# Altium footprint library PCB-PCEIOT.PcbLib: 119 footprints (part 3 of 8)
Each footprint in its own frame and in the unit in brackets; x right, y up, seen from the top. Pads: shape width x height; smd on the part's side, far side on the other; paste and mask are expansions set on the pad; w line width, h text height; cw(c..) or ccw(c..) is an arc to the next point about the centre after c.
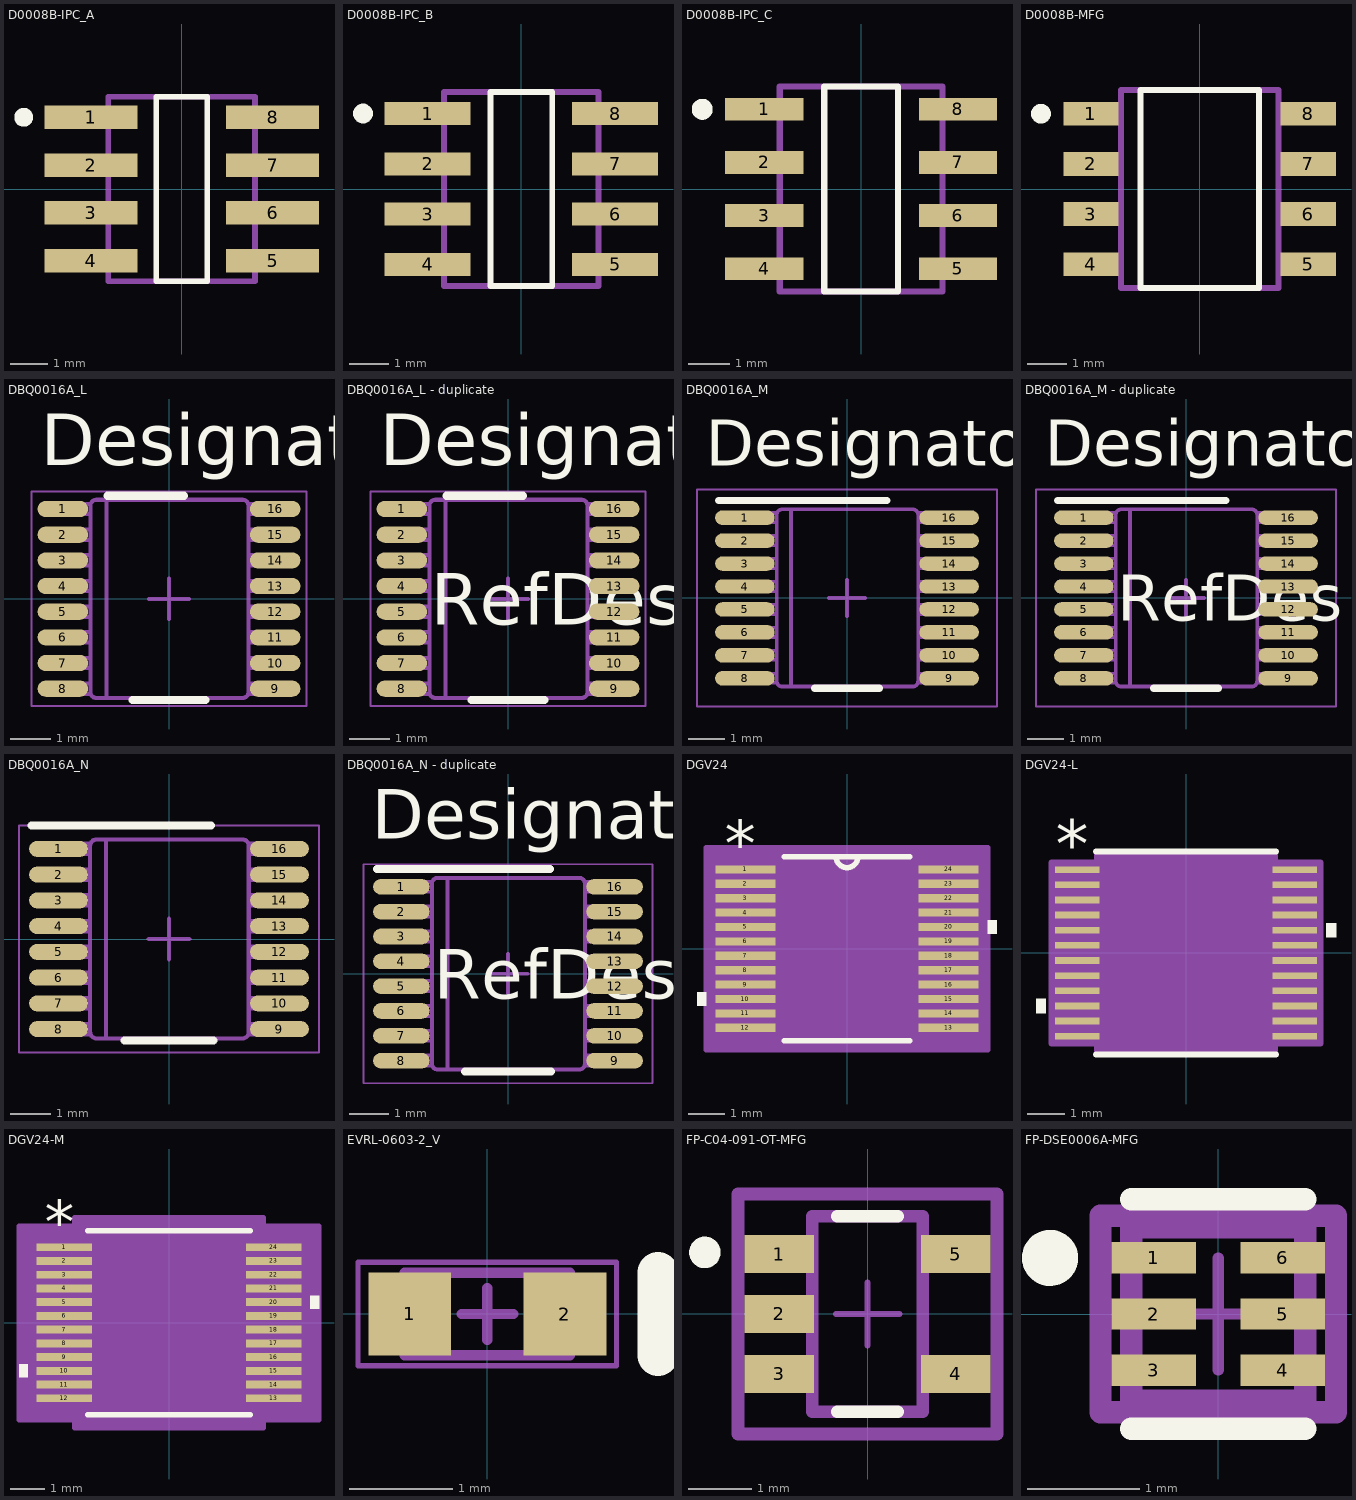
[diagram p2: the footprints below, top view; thin cyan lines are the x and y axes]

## D0008B-IPC_A [mm]
pads (8):
  rect 2.469x0.622 smd paste+0 mask+0: 1(-2.414,1.905) 2(-2.414,0.635) 3(-2.414,-0.635) 4(-2.414,-1.905) 5(2.414,-1.905) 6(2.414,-0.635) 7(2.414,0.635) 8(2.414,1.905)
Top Overlay:
  circle w0.25: c-4.198,1.905 r0.125
  lines w0.15: -0.679,-2.452 0.679,-2.452 0.679,2.452 -0.679,2.452 -0.679,-2.452
Mechanical 13:
  lines w0.15: -1.947,-2.452 1.947,-2.452 1.947,2.452 -1.947,2.452 -1.947,-2.452
Mechanical 15:
  text ".Designator" at 0.272,-2.705 h1.2

## D0008B-IPC_B [mm]
pads (8):
  rect 2.169x0.582 smd paste+0 mask+0: 1(-2.364,1.905) 2(-2.364,0.635) 3(-2.364,-0.635) 4(-2.364,-1.905) 5(2.364,-1.905) 6(2.364,-0.635) 7(2.364,0.635) 8(2.364,1.905)
Top Overlay:
  circle w0.25: c-3.998,1.905 r0.125
  lines w0.15: -0.779,-2.452 -0.779,2.452 0.779,2.452 0.779,-2.452 -0.779,-2.452
Mechanical 13:
  lines w0.15: -1.947,-2.452 -1.947,2.452 1.947,2.452 1.947,-2.452 -1.947,-2.452
Mechanical 15:
  text ".Designator" at 0.272,-2.705 h1.2

## D0008B-IPC_C [mm]
pads (8):
  rect 1.869x0.542 smd paste+0 mask+0: 1(-2.314,1.905) 2(-2.314,0.635) 3(-2.314,-0.635) 4(-2.314,-1.905) 5(2.314,-1.905) 6(2.314,-0.635) 7(2.314,0.635) 8(2.314,1.905)
Top Overlay:
  circle w0.25: c-3.798,1.905 r0.125
  lines w0.15: -0.879,-2.452 -0.879,2.452 0.879,2.452 0.879,-2.452 -0.879,-2.452
Mechanical 13:
  lines w0.15: -1.947,-2.452 -1.947,2.452 1.947,2.452 1.947,-2.452 -1.947,-2.452
Mechanical 15:
  text ".Designator" at 0.272,-2.705 h1.2

## D0008B-MFG [mm]
pads (8):
  rect 1.4x0.6 smd paste+0 mask+0: 1(-2.75,1.905) 2(-2.75,0.635) 3(-2.75,-0.635) 4(-2.75,-1.905) 5(2.75,-1.905) 6(2.75,-0.635) 7(2.75,0.635) 8(2.75,1.905)
Top Overlay:
  circle w0.25: c-4.015,1.905 r0.125
  lines w0.15: -1.5,-2.5 1.5,-2.5 1.5,2.5 -1.5,2.5 -1.5,-2.5
Mechanical 13:
  lines w0.15: -1.99,-2.5 1.99,-2.5 1.99,2.5 -1.99,2.5 -1.99,-2.5
Mechanical 15:
  text ".Designator" at 0.272,-2.705 h1.2

## DBQ0016A_L [mm]
pads (16):
  oval 1.25x0.4 smd paste+0 mask+0.051: 1(-2.625,2.222) 2(-2.625,1.587) 3(-2.625,0.953) 4(-2.625,0.318) 5(-2.625,-0.318) 6(-2.625,-0.953) 7(-2.625,-1.587) 8(-2.625,-2.222) 9(2.625,-2.222) 10(2.625,-1.587) 11(2.625,-0.953) 12(2.625,-0.318) 13(2.625,0.318) 14(2.625,0.953) 15(2.625,1.587) 16(2.625,2.222)
Top Overlay:
  lines w0.2: -1.525,2.55 0.375,2.55 ; -0.9,-2.5 0.9,-2.5
  text "Designator238" at -3.175,3.302 h1.27
  text ".Designator" at -3.492,-0.635 h1.27
Mechanical 13:
  drawing of 209 lines, arcs and shapes, not listed
  text ".Designator" at -3.492,-0.635 h1.27
Mechanical 15:
  lines w0.05: -3.4,-2.65 3.4,-2.65 3.4,2.65 -3.4,2.65 -3.4,-2.65
  lines w0.1: -0.5,0 0.5,0 ; 0,-0.5 0,0.5

## DBQ0016A_L - duplicate [mm]
pads (16):
  oval 1.25x0.4 smd paste+0 mask+0.051: 1(-2.625,2.222) 2(-2.625,1.587) 3(-2.625,0.953) 4(-2.625,0.318) 5(-2.625,-0.318) 6(-2.625,-0.953) 7(-2.625,-1.587) 8(-2.625,-2.222) 9(2.625,-2.222) 10(2.625,-1.587) 11(2.625,-0.953) 12(2.625,-0.318) 13(2.625,0.318) 14(2.625,0.953) 15(2.625,1.587) 16(2.625,2.222)
Top Overlay:
  lines w0.2: -1.525,2.55 0.375,2.55 ; -0.9,-2.5 0.9,-2.5
  text "RefDes" at -1.905,-0.635 h1.27
  text "Designator238" at -3.175,3.302 h1.27
Mechanical 13:
  drawing of 209 lines, arcs and shapes, not listed
Mechanical 15:
  lines w0.05: -3.4,-2.65 -3.4,2.65 3.4,2.65 3.4,-2.65 -3.4,-2.65
  lines w0.1: -0.5,0 0.5,0 ; 0,-0.5 0,0.5

## DBQ0016A_M [mm]
pads (16):
  oval 1.65x0.4 smd paste+0 mask+0.051: 1(-2.825,2.222) 2(-2.825,1.587) 3(-2.825,0.953) 4(-2.825,0.318) 5(-2.825,-0.318) 6(-2.825,-0.953) 7(-2.825,-1.587) 8(-2.825,-2.222) 9(2.825,-2.222) 10(2.825,-1.587) 11(2.825,-0.953) 12(2.825,-0.318) 13(2.825,0.318) 14(2.825,0.953) 15(2.825,1.587) 16(2.825,2.222)
Top Overlay:
  lines w0.2: -3.55,2.7 1.1,2.7 ; -0.9,-2.5 0.9,-2.5
  text ".Designator" at -3.492,-0.635 h1.27
  text "Designator239" at -3.912,3.658 h1.27
Mechanical 13:
  drawing of 209 lines, arcs and shapes, not listed
  text ".Designator" at -3.492,-0.635 h1.27
Mechanical 15:
  lines w0.05: -4.15,-3 4.15,-3 4.15,3 -4.15,3 -4.15,-3
  lines w0.1: -0.5,0 0.5,0 ; 0,-0.5 0,0.5

## DBQ0016A_M - duplicate [mm]
pads (16):
  oval 1.65x0.4 smd paste+0 mask+0.051: 1(-2.825,2.222) 2(-2.825,1.587) 3(-2.825,0.953) 4(-2.825,0.318) 5(-2.825,-0.318) 6(-2.825,-0.953) 7(-2.825,-1.587) 8(-2.825,-2.222) 9(2.825,-2.222) 10(2.825,-1.587) 11(2.825,-0.953) 12(2.825,-0.318) 13(2.825,0.318) 14(2.825,0.953) 15(2.825,1.587) 16(2.825,2.222)
Top Overlay:
  lines w0.2: -3.55,2.7 1.1,2.7 ; -0.9,-2.5 0.9,-2.5
  text "RefDes" at -1.905,-0.635 h1.27
  text "Designator239" at -3.912,3.658 h1.27
Mechanical 13:
  drawing of 209 lines, arcs and shapes, not listed
Mechanical 15:
  lines w0.05: -4.15,-3 4.15,-3 4.15,3 -4.15,3 -4.15,-3
  lines w0.1: -0.5,0 0.5,0 ; 0,-0.5 0,0.5

## DBQ0016A_N [mm]
pads (16):
  oval 1.45x0.4 smd paste+0 mask+0.051: 1(-2.725,2.222) 2(-2.725,1.587) 3(-2.725,0.953) 4(-2.725,0.318) 5(-2.725,-0.318) 6(-2.725,-0.953) 7(-2.725,-1.587) 8(-2.725,-2.222) 9(2.725,-2.222) 10(2.725,-1.587) 11(2.725,-0.953) 12(2.725,-0.318) 13(2.725,0.318) 14(2.725,0.953) 15(2.725,1.587) 16(2.725,2.222)
Top Overlay:
  lines w0.2: -3.391,2.8 1.034,2.8 ; -1.1,-2.5 1.1,-2.5
Mechanical 13:
  drawing of 209 lines, arcs and shapes, not listed
Mechanical 15:
  lines w0.05: -3.7,-2.8 3.7,-2.8 3.7,2.8 -3.7,2.8 -3.7,-2.8
  lines w0.1: -0.5,0 0.5,0 ; 0,-0.5 0,0.5

## DBQ0016A_N - duplicate [mm]
pads (16):
  oval 1.45x0.4 smd paste+0 mask+0.051: 1(-2.725,2.222) 2(-2.725,1.587) 3(-2.725,0.953) 4(-2.725,0.318) 5(-2.725,-0.318) 6(-2.725,-0.953) 7(-2.725,-1.587) 8(-2.725,-2.222) 9(2.725,-2.222) 10(2.725,-1.587) 11(2.725,-0.953) 12(2.725,-0.318) 13(2.725,0.318) 14(2.725,0.953) 15(2.725,1.587) 16(2.725,2.222)
Top Overlay:
  lines w0.2: -3.35,2.675 1.075,2.675 ; -1.1,-2.5 1.1,-2.5
  text "RefDes" at -1.905,-0.635 h1.27
  text "Designator240" at -3.48,3.454 h1.27
Mechanical 13:
  drawing of 209 lines, arcs and shapes, not listed
Mechanical 15:
  lines w0.05: -3.7,-2.8 3.7,-2.8 3.7,2.8 -3.7,2.8 -3.7,-2.8
  lines w0.1: -0.5,0 0.5,0 ; 0,-0.5 0,0.5

## DGV24 [mil]
pads (24):
  rect 66x9 smd paste-33 mask-33: 1(-111,86.61) 2(-111,70.87) 3(-111,55.12) 4(-111,39.37) 5(-111,23.62) 6(-111,7.87) 7(-111,-7.87) 8(-111,-23.62) 9(-111,-39.37) 10(-111,-55.12) 11(-111,-70.87) 12(-111,-86.61) 13(111,-86.61) 14(111,-70.87) 15(111,-55.12) 16(111,-39.37) 17(111,-23.62) 18(111,-7.87) 19(111,7.87) 20(111,23.62) 21(111,39.37) 22(111,55.12) 23(111,70.87) 24(111,86.61)
Top Overlay:
  region: -154,-47.62 -164,-47.62 -164,-62.62 -154,-62.62
  region: 154,31.12 164,31.12 164,16.12 154,16.12
  lines w6: -68.86,-100.5 68.86,-100.5 ; -68.86,100.5 68.86,100.5 ; -12,100.5 ccw(c0,100.5) 12,100.5
  text "*" at -133.5,90.61 h50
Mechanical 13:
  lines w1: -12,100.5 ccw(c0,100.5) 12,100.5 ; -130,-91.11 -130,-82.11 -88.5,-82.11 -88.5,-91.11 -130,-91.11 ; -130,-75.37 -130,-66.37 -88.5,-66.37 -88.5,-75.37 -130,-75.37 ; -130,-59.62 -130,-50.62 -88.5,-50.62 -88.5,-59.62 -130,-59.62 ; -130,-43.87 -130,-34.87 -88.5,-34.87 -88.5,-43.87 -130,-43.87 ; -130,-28.12 -130,-19.12 -88.5,-19.12 -88.5,-28.12 -130,-28.12 ; -130,-12.37 -130,-3.37 -88.5,-3.37 -88.5,-12.37 -130,-12.37 ; -130,3.37 -130,12.37 -88.5,12.37 -88.5,3.37 -130,3.37 ; -130,19.12 -130,28.12 -88.5,28.12 -88.5,19.12 -130,19.12 ; -130,34.87 -130,43.87 -88.5,43.87 -88.5,34.87 -130,34.87 ; -130,50.62 -130,59.62 -88.5,59.62 -88.5,50.62 -130,50.62 ; -130,66.37 -130,75.37 -88.5,75.37 -88.5,66.37 -130,66.37 ; -130,82.11 -130,91.11 -88.5,91.11 -88.5,82.11 -130,82.11 ; -88.5,-100.5 88.5,-100.5 88.5,100.5 -88.5,100.5 -88.5,-100.5 ; 88.5,-91.11 88.5,-82.11 130,-82.11 130,-91.11 88.5,-91.11 ; 88.5,-75.37 88.5,-66.37 130,-66.37 130,-75.37 88.5,-75.37 ; 88.5,-59.62 88.5,-50.62 130,-50.62 130,-59.62 88.5,-59.62 ; 88.5,-43.87 88.5,-34.87 130,-34.87 130,-43.87 88.5,-43.87 ; 88.5,-28.12 88.5,-19.12 130,-19.12 130,-28.12 88.5,-28.12 ; 88.5,-12.37 88.5,-3.37 130,-3.37 130,-12.37 88.5,-12.37 ; 88.5,3.37 88.5,12.37 130,12.37 130,3.37 88.5,3.37 ; 88.5,19.12 88.5,28.12 130,28.12 130,19.12 88.5,19.12 ; 88.5,34.87 88.5,43.87 130,43.87 130,34.87 88.5,34.87 ; 88.5,50.62 88.5,59.62 130,59.62 130,50.62 88.5,50.62 ; 88.5,66.37 88.5,75.37 130,75.37 130,66.37 88.5,66.37 ; 88.5,82.11 88.5,91.11 130,91.11 130,82.11 88.5,82.11
  text "*" at -133.5,90.61 h50
Mechanical 15:
  region: 154,-110.5 -154,-110.5 -154,110.5 154,110.5
  lines w6: -154,-110.5 -154,110.5 154,110.5 154,-110.5 -154,-110.5
3D body "DGV24.step": height 47.09, standoff 0, extent -130,-100.51 130,100.51

## DGV24-L [mil]
pads (24):
  rect 46x7 smd paste+0 mask+0: 1(-113,86.61) 2(-113,70.87) 3(-113,55.12) 4(-113,39.37) 5(-113,23.62) 6(-113,7.87) 7(-113,-7.87) 8(-113,-23.62) 9(-113,-39.37) 10(-113,-55.12) 11(-113,-70.87) 12(-113,-86.61) 13(113,-86.61) 14(113,-70.87) 15(113,-55.12) 16(113,-39.37) 17(113,-23.62) 18(113,-7.87) 19(113,7.87) 20(113,23.62) 21(113,39.37) 22(113,55.12) 23(113,70.87) 24(113,86.61)
Top Overlay:
  region: -146,-47.62 -156,-47.62 -156,-62.62 -146,-62.62
  region: 146,31.12 156,31.12 156,16.12 146,16.12
  lines w6: -93.5,-105.5 93.5,-105.5 ; -93.5,105.5 93.5,105.5
  text "*" at -135.5,88.61 h50
  text ".Designator" at -137.5,-25 h50
Mechanical 13:
  lines w1: -12,100.5 ccw(c0,100.5) 12,100.5 ; -130,-91.11 -130,-82.11 -88.5,-82.11 -88.5,-91.11 -130,-91.11 ; -130,-75.37 -130,-66.37 -88.5,-66.37 -88.5,-75.37 -130,-75.37 ; -130,-59.62 -130,-50.62 -88.5,-50.62 -88.5,-59.62 -130,-59.62 ; -130,-43.87 -130,-34.87 -88.5,-34.87 -88.5,-43.87 -130,-43.87 ; -130,-28.12 -130,-19.12 -88.5,-19.12 -88.5,-28.12 -130,-28.12 ; -130,-12.37 -130,-3.37 -88.5,-3.37 -88.5,-12.37 -130,-12.37 ; -130,3.37 -130,12.37 -88.5,12.37 -88.5,3.37 -130,3.37 ; -130,19.12 -130,28.12 -88.5,28.12 -88.5,19.12 -130,19.12 ; -130,34.87 -130,43.87 -88.5,43.87 -88.5,34.87 -130,34.87 ; -130,50.62 -130,59.62 -88.5,59.62 -88.5,50.62 -130,50.62 ; -130,66.37 -130,75.37 -88.5,75.37 -88.5,66.37 -130,66.37 ; -130,82.11 -130,91.11 -88.5,91.11 -88.5,82.11 -130,82.11 ; -88.5,-100.5 88.5,-100.5 88.5,100.5 -88.5,100.5 -88.5,-100.5 ; 88.5,-91.11 88.5,-82.11 130,-82.11 130,-91.11 88.5,-91.11 ; 88.5,-75.37 88.5,-66.37 130,-66.37 130,-75.37 88.5,-75.37 ; 88.5,-59.62 88.5,-50.62 130,-50.62 130,-59.62 88.5,-59.62 ; 88.5,-43.87 88.5,-34.87 130,-34.87 130,-43.87 88.5,-43.87 ; 88.5,-28.12 88.5,-19.12 130,-19.12 130,-28.12 88.5,-28.12 ; 88.5,-12.37 88.5,-3.37 130,-3.37 130,-12.37 88.5,-12.37 ; 88.5,3.37 88.5,12.37 130,12.37 130,3.37 88.5,3.37 ; 88.5,19.12 88.5,28.12 130,28.12 130,19.12 88.5,19.12 ; 88.5,34.87 88.5,43.87 130,43.87 130,34.87 88.5,34.87 ; 88.5,50.62 88.5,59.62 130,59.62 130,50.62 88.5,50.62 ; 88.5,66.37 88.5,75.37 130,75.37 130,66.37 88.5,66.37 ; 88.5,82.11 88.5,91.11 130,91.11 130,82.11 88.5,82.11
  text ".Designator" at -137.5,-25 h50
  text "*" at -86,47.5 h50
Mechanical 15:
  region: -92.5,-94.11 -140,-94.11 -140,94.11 -92.5,94.11 -92.5,104.5 92.5,104.5 92.5,94.11 140,94.11 140,-94.11 92.5,-94.11 92.5,-104.5 -92.5,-104.5
  lines w6: -140,-94.11 -140,94.11 -92.5,94.11 -92.5,104.5 92.5,104.5 92.5,94.11 140,94.11 140,-94.11 92.5,-94.11 92.5,-104.5 -92.5,-104.5 -92.5,-94.11 -140,-94.11
3D body "DGV24.step": height 47.09, standoff 0, extent -130,-100.51 130,100.51

## DGV24-M [mil]
pads (24):
  rect 63.5x9 smd paste+0 mask+0: 1(-120.25,86.61) 2(-120.25,70.87) 3(-120.25,55.12) 4(-120.25,39.37) 5(-120.25,23.62) 6(-120.25,7.87) 7(-120.25,-7.87) 8(-120.25,-23.62) 9(-120.25,-39.37) 10(-120.25,-55.12) 11(-120.25,-70.87) 12(-120.25,-86.61) 13(120.25,-86.61) 14(120.25,-70.87) 15(120.25,-55.12) 16(120.25,-39.37) 17(120.25,-23.62) 18(120.25,-7.87) 19(120.25,7.87) 20(120.25,23.62) 21(120.25,39.37) 22(120.25,55.12) 23(120.25,70.87) 24(120.25,86.61)
Top Overlay:
  region: -162,-47.62 -172,-47.62 -172,-62.62 -162,-62.62
  region: 162,31.12 172,31.12 172,16.12 162,16.12
  lines w6: -93.5,-105.5 93.5,-105.5 ; -93.5,105.5 93.5,105.5
  text "*" at -142.75,90.61 h50
  text ".Designator" at -137.5,-25 h50
Mechanical 13:
  lines w1: -12,100.5 ccw(c0,100.5) 12,100.5 ; -130,-91.11 -130,-82.11 -88.5,-82.11 -88.5,-91.11 -130,-91.11 ; -130,-75.37 -130,-66.37 -88.5,-66.37 -88.5,-75.37 -130,-75.37 ; -130,-59.62 -130,-50.62 -88.5,-50.62 -88.5,-59.62 -130,-59.62 ; -130,-43.87 -130,-34.87 -88.5,-34.87 -88.5,-43.87 -130,-43.87 ; -130,-28.12 -130,-19.12 -88.5,-19.12 -88.5,-28.12 -130,-28.12 ; -130,-12.37 -130,-3.37 -88.5,-3.37 -88.5,-12.37 -130,-12.37 ; -130,3.37 -130,12.37 -88.5,12.37 -88.5,3.37 -130,3.37 ; -130,19.12 -130,28.12 -88.5,28.12 -88.5,19.12 -130,19.12 ; -130,34.87 -130,43.87 -88.5,43.87 -88.5,34.87 -130,34.87 ; -130,50.62 -130,59.62 -88.5,59.62 -88.5,50.62 -130,50.62 ; -130,66.37 -130,75.37 -88.5,75.37 -88.5,66.37 -130,66.37 ; -130,82.11 -130,91.11 -88.5,91.11 -88.5,82.11 -130,82.11 ; -88.5,-100.5 88.5,-100.5 88.5,100.5 -88.5,100.5 -88.5,-100.5 ; 88.5,-91.11 88.5,-82.11 130,-82.11 130,-91.11 88.5,-91.11 ; 88.5,-75.37 88.5,-66.37 130,-66.37 130,-75.37 88.5,-75.37 ; 88.5,-59.62 88.5,-50.62 130,-50.62 130,-59.62 88.5,-59.62 ; 88.5,-43.87 88.5,-34.87 130,-34.87 130,-43.87 88.5,-43.87 ; 88.5,-28.12 88.5,-19.12 130,-19.12 130,-28.12 88.5,-28.12 ; 88.5,-12.37 88.5,-3.37 130,-3.37 130,-12.37 88.5,-12.37 ; 88.5,3.37 88.5,12.37 130,12.37 130,3.37 88.5,3.37 ; 88.5,19.12 88.5,28.12 130,28.12 130,19.12 88.5,19.12 ; 88.5,34.87 88.5,43.87 130,43.87 130,34.87 88.5,34.87 ; 88.5,50.62 88.5,59.62 130,59.62 130,50.62 88.5,50.62 ; 88.5,66.37 88.5,75.37 130,75.37 130,66.37 88.5,66.37 ; 88.5,82.11 88.5,91.11 130,91.11 130,82.11 88.5,82.11
  text ".Designator" at -137.5,-25 h50
  text "*" at -86,47.5 h50
Mechanical 15:
  region: -108.5,-111.11 -172,-111.11 -172,111.11 -108.5,111.11 -108.5,120.5 108.5,120.5 108.5,111.11 172,111.11 172,-111.11 108.5,-111.11 108.5,-120.5 -108.5,-120.5
  lines w6: -172,-111.11 -172,111.11 -108.5,111.11 -108.5,120.5 108.5,120.5 108.5,111.11 172,111.11 172,-111.11 108.5,-111.11 108.5,-120.5 -108.5,-120.5 -108.5,-111.11 -172,-111.11
3D body "DGV24.step": height 47.09, standoff 0, extent -130,-100.51 130,100.51

## EVRL-0603-2_V [mm] "SMD, 2-Leads, Body 1.6x0.8mm"
height 0.5
pads (2):
  rect 0.8x0.8 smd: 1(-0.75,0) 2(0.75,0)
Top Overlay:
  lines w0.4: 1.65,-0.4 1.65,0.4
Mechanical 13:
  lines w0.1: -0.8,-0.4 -0.8,0.4 0.8,0.4 0.8,-0.4 -0.8,-0.4
Mechanical 15:
  lines w0.05: -1.25,-0.5 -1.25,0.5 1.25,0.5 1.25,-0.5 -1.25,-0.5
  lines w0.1: -0.25,0 0.25,0 ; 0,-0.25 0,0.25
3D body: height 0.5, standoff 0, extent -0.5,-0.4 0.5,0.4
3D body: height 0.15, standoff 0, extent -0.8,-0.4 0.8,0.4

## FP-C04-091-OT-MFG [mm]
height 0.6
pads (5):
  rect 1.1x0.6 smd paste+0 mask+0: 1(-1.4,0.95) 2(-1.4,0) 3(-1.4,-0.95) 4(1.4,-0.95) 5(1.4,0.95)
Top Overlay:
  circle w0.25: c-2.575,0.975 r0.125
  lines w0.2: -0.475,-1.55 0.475,-1.55 ; -0.475,1.55 0.475,1.55
Top 3D Body:
  lines w0.2: -0.875,-1.55 0.875,-1.55 0.875,1.55 -0.875,1.55 -0.875,-1.55
Top Courtyard:
  lines w0.2: -2.05,-1.9 2.05,-1.9 2.05,1.9 -2.05,1.9 -2.05,-1.9
Top Assembly:
  lines w0.2: -2.05,-1.9 2.05,-1.9 2.05,1.9 -2.05,1.9 -2.05,-1.9
  text ".Designator" at 0,-0.883 h1
Top Component Center:
  lines w0.1: -0.5,0 0.5,0 ; 0,-0.5 0,0.5
3D body "SOT-23-5_MC_MCH.step": height 1.45, standoff 0, extent -1.6,-1.549 1.6,1.549

## FP-DSE0006A-MFG [mm]
height 0.6
pads (6):
  rect 0.75x0.28 smd paste-1000 mask+0: 1(-0.575,0.5) 2(-0.575,0) 3(-0.575,-0.5) 4(0.575,-0.5) 5(0.575,0) 6(0.575,0.5)
Top Overlay:
  circle w0.25: c-1.5,0.5 r0.125
  lines w0.2: -0.775,-1.025 0.775,-1.025 ; -0.775,1.025 0.775,1.025
Top Paste:
  rectangle: 0.225,-0.615 0.925,-0.385
  rectangle: 0.225,-0.115 0.925,0.115
  rectangle: 0.225,0.385 0.925,0.615
  rectangle: -0.925,-0.615 -0.225,-0.385
  rectangle: -0.925,-0.115 -0.225,0.115
  rectangle: -0.925,0.385 -0.225,0.615
Top 3D Body:
  lines w0.2: -0.775,-0.775 0.775,-0.775 0.775,0.775 -0.775,0.775 -0.775,-0.775
Top Courtyard:
  lines w0.2: -1.05,-0.875 1.05,-0.875 1.05,0.875 -1.05,0.875 -1.05,-0.875
Top Assembly:
  lines w0.2: -1.05,-0.875 1.05,-0.875 1.05,0.875 -1.05,0.875 -1.05,-0.875
  text ".Designator" at 0,-0.695 h1
Top Component Center:
  lines w0.1: -0.5,0 0.5,0 ; 0,-0.5 0,0.5
3D body "IC_Texas_Instruments_BQ29700DSET_eec.STEP": height 0.25, standoff 0, extent -1.05,-0.875 1.05,0.875